# Altium footprint library Miscellaneous Devices LC.PcbLib: 776 footprints (part 30 of 49)
Each footprint in its own frame and in the unit in brackets; x right, y up, seen from the top. Pads: shape width x height; smd on the part's side, far side on the other; paste and mask are expansions set on the pad; w line width, h text height; cw(c..) or ccw(c..) is an arc to the next point about the centre after c.
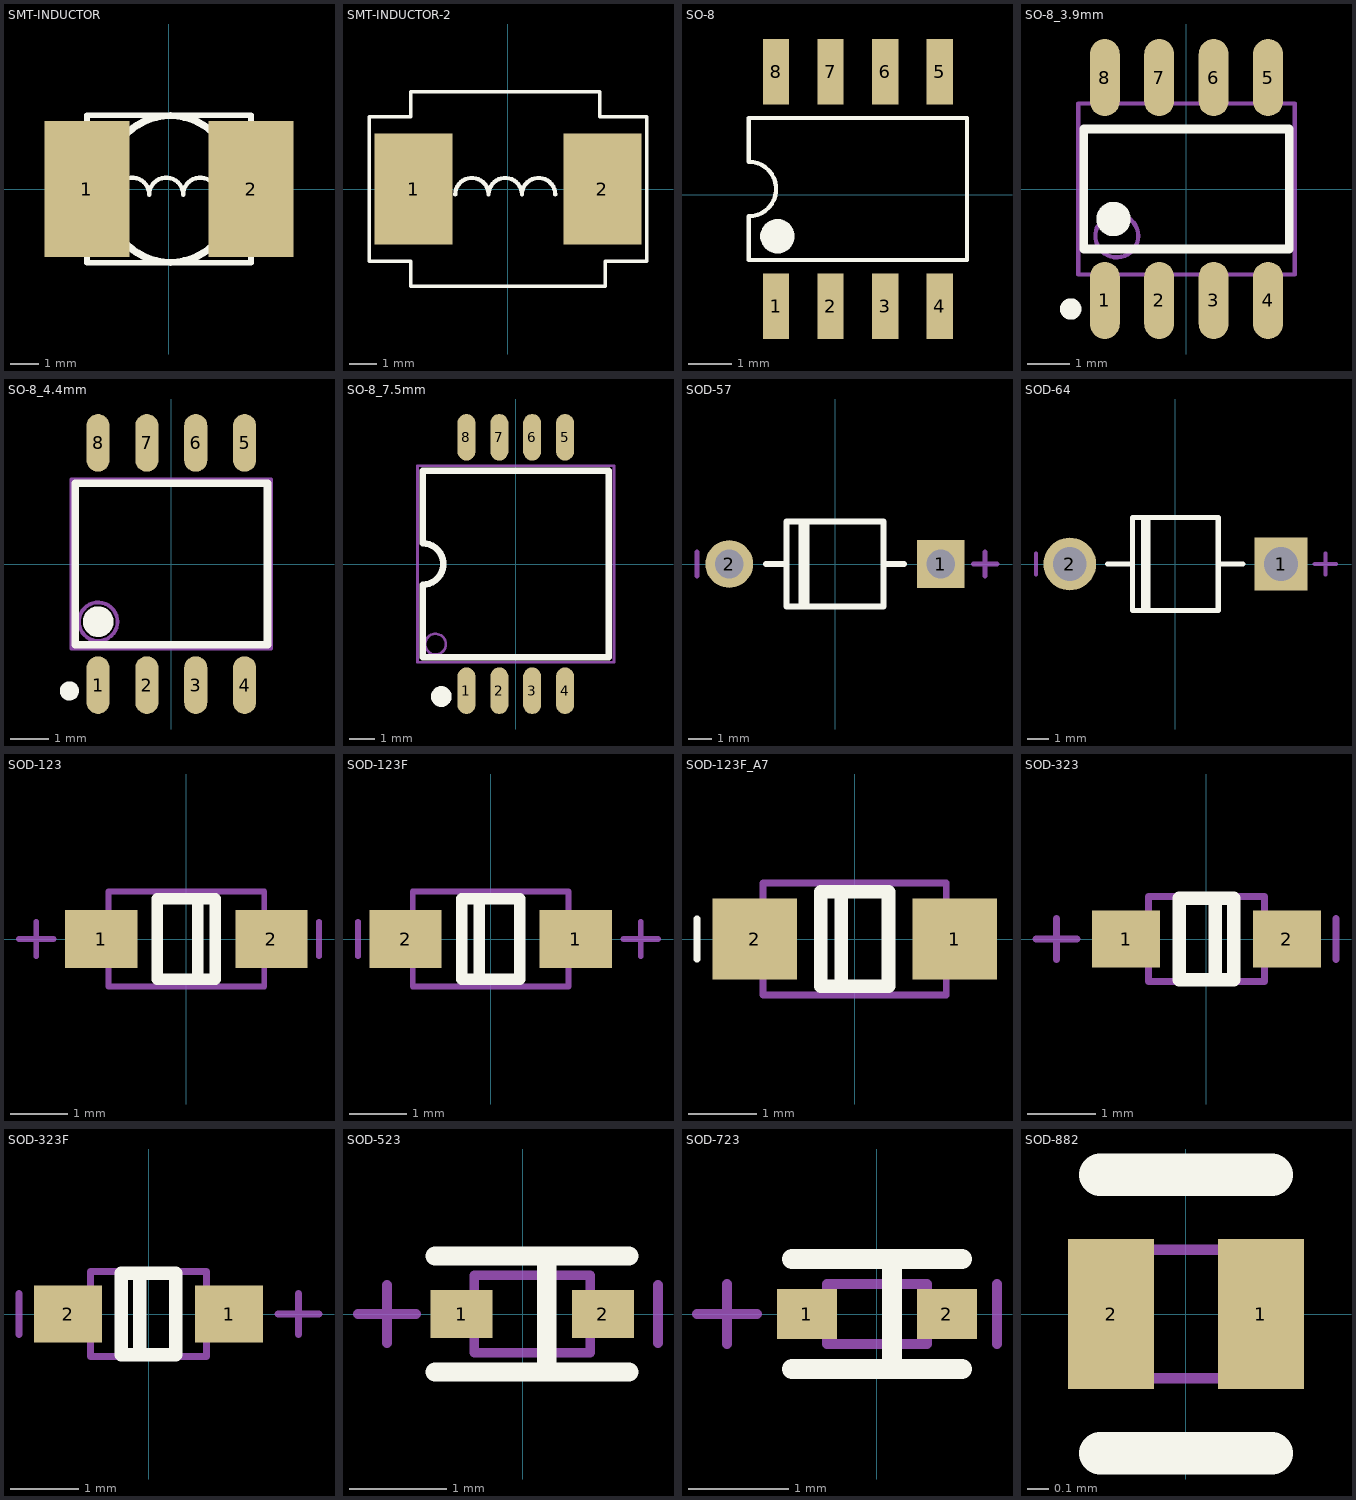
[diagram p29: the footprints below, top view; thin cyan lines are the x and y axes]

## SMT-INDUCTOR [mm]
pads (2):
  rect 3x4.8 smd: 1(-2.9,0) 2(2.9,0)
Top Overlay:
  lines w0.15: -1.9,-0.2 cw(c-1.3,-0.2) -0.7,-0.2 cw(c-0.1,-0.2) 0.5,-0.2 cw(c1.1,-0.2) 1.7,-0.2
  lines w0.2: -2.9,-1.6 -2.9,-2.6 0,-2.6 2.9,-2.6 2.9,-1.6 ; -2.9,1.6 -2.9,2.6 0,2.6 2.9,2.6 2.9,1.6
  lines w0.254: -1.5,-1.95 ccw(c0.05,-0.4) 1.6,-1.95 ; -1.5,1.95 cw(c0.05,0.4) 1.6,1.95
3D body "User Library-SPI0705 (SD75)贴片电感.step": height 3.3, standoff 0, extent -3.55,-3.7 3.75,3.6

## SMT-INDUCTOR-2 [mm]
pads (2):
  rect 2.8x4 smd: 1(-3.4,0) 2(3.4,0)
Top Overlay:
  lines w0.127: -5,-2.6 -5,2.6 -3.5,2.6 -3.5,3.5 3.3,3.5 3.3,2.6 5,2.6 5,-2.6 3.5,-2.6 3.5,-3.5 -3.5,-3.5 -3.5,-2.6 -5,-2.6
  lines w0.15: -1.9,-0.2 cw(c-1.3,-0.2) -0.7,-0.2 cw(c-0.1,-0.2) 0.5,-0.2 cw(c1.1,-0.2) 1.7,-0.2
3D body "User Library-SPI0705 (SD75)贴片电感.step": height 3.3, standoff 0, extent -3.677,-3.7 3.623,3.6

## SO-8 [mil]
pads (8):
  rect 24x60 smd: 1(178.5,-102.07) 2(228.5,-102.07) 3(278.5,-102.07) 4(328.5,-102.07) 5(328.5,112.93) 6(278.5,112.93) 7(228.5,112.93) 8(178.5,112.93)
Top Overlay:
  circle w19.68: c179.68,-37.87 r5.91
  lines w3.94: 153.5,-59.57 153.5,-19.57 ccw(c153.51,5.43) 153.51,30.43 153.5,70.43 353.5,70.43 353.5,-59.57 153.5,-59.57
3D body "SO8.STEP": height 57, standoff 0, extent 157,-108.75 350,118.75

## SO-8_3.9mm [mm]
pads (8):
  oval 0.7x1.8 smd: 1(-1.905,-2.6) 2(-0.635,-2.6) 3(0.635,-2.6) 4(1.905,-2.6) 5(1.905,2.6) 6(0.635,2.6) 7(-0.635,2.6) 8(-1.905,2.6)
Top Overlay:
  circle w0.25: c-2.7,-2.8 r0.125
  circle w0.4: c-1.7,-0.7 r0.2
  lines w0.2: -2.4,-1.4 -2.4,1.4 2.4,1.4 2.4,-1.4 -2.4,-1.4
Mechanical 13:
  circle w0.1: c-1.625,-1.095 r0.5
  lines w0.1: -2.525,-1.995 -2.525,1.995 2.525,1.995 2.525,-1.995 -2.525,-1.995

## SO-8_4.4mm [mm]
pads (8):
  oval 0.6x1.5 smd: 1(-1.905,-3.15) 2(-0.635,-3.15) 3(0.635,-3.15) 4(1.905,-3.15) 5(1.905,3.15) 6(0.635,3.15) 7(-0.635,3.15) 8(-1.905,3.15)
Top Overlay:
  circle w0.25: c-2.65,-3.3 r0.125
  circle w0.4: c-1.9,-1.5 r0.2
  lines w0.2: -2.5,-2.1 -2.5,2.1 2.5,2.1 2.5,-2.1 -2.5,-2.1
Mechanical 13:
  circle w0.1: c-1.9,-1.5 r0.5
  lines w0.1: -2.6,-2.2 -2.6,2.2 2.6,2.2 2.6,-2.2 -2.6,-2.2

## SO-8_7.5mm [mm]
pads (8):
  oval 0.7x1.8 smd: 1(-1.905,-4.9) 2(-0.635,-4.9) 3(0.635,-4.9) 4(1.905,-4.9) 5(1.905,4.9) 6(0.635,4.9) 7(-0.635,4.9) 8(-1.905,4.9)
Top Overlay:
  circle w0.4: c-2.875,-5.125 r0.2
  lines w0.254: -3.6,-3.6 3.6,-3.6 3.6,3.6 -3.6,3.6 -3.6,0.8 cw(c-3.6,0) -3.6,-0.8 -3.6,-3.6
Mechanical 13:
  circle w0.1: c-3.1,-3.1 r0.4
  lines w0.1: -3.8,-3.8 3.8,-3.8 3.8,3.8 -3.8,3.8 -3.8,-3.8

## SOD-57 [mm]
pads (2):
  rect 2x2 hole 1.2: 1(4.445,0)
  round 2 hole 1.2: 2(-4.445,0)
Top Overlay:
  lines w0.254: -2.9,0 -2.032,0 ; -1.4,-1.778 -1.4,1.778 ; -1.2,-1.778 -1.2,1.778 ; 2.032,0 2.9,0 ; -2.032,-1.778 2.032,-1.778 2.032,1.778 -2.032,1.778 -2.032,-1.778
Mechanical 15:
  lines w0.203: -5.8,-0.5 -5.8,0.5 ; 5.8,0 6.8,0 ; 6.3,-0.5 6.3,0.5

## SOD-64 [mm]
pads (2):
  rect 2.5x2.5 hole 1.6: 1(5,0)
  round 2.5 hole 1.6: 2(-5,0)
Top Overlay:
  lines w0.254: -3.2,0 -2.032,0 ; -1.5,-2.2 -1.5,2.2 ; -1.3,-2.2 -1.3,2.2 ; 2.032,0 3.2,0 ; -2.032,-2.2 -2.032,2.2 2.032,2.2 2.032,-2.2 -2.032,-2.2
Mechanical 15:
  lines w0.203: -6.6,-0.5 -6.6,0.5 ; 6.6,0 7.6,0 ; 7.1,-0.5 7.1,0.5

## SOD-123 [mm]
pads (2):
  rect 1.25x1 smd: 1(-1.475,0) 2(1.475,0)
Top Overlay:
  lines w0.2: 0.2,-0.7 0.2,0.7 ; -0.5,-0.7 -0.5,0.7 0.5,0.7 0.5,-0.7 -0.5,-0.7
Mechanical 13:
  lines w0.1: -1.35,-0.825 -1.35,0.825 1.35,0.825 1.35,-0.825 -1.35,-0.825
Mechanical 15:
  lines w0.1: -2.9,0 -2.3,0 ; -2.6,-0.3 -2.6,0.3 ; 2.3,-0.3 2.3,0.3
3D body "SOD-123.STEP": height 1.2, standoff 0, extent -1.85,-0.8 1.85,0.8

## SOD-123F [mm]
pads (2):
  rect 1.25x1 smd: 1(1.475,0) 2(-1.475,0)
Top Overlay:
  lines w0.2: -0.2,-0.7 -0.2,0.7 ; -0.5,-0.7 -0.5,0.7 0.5,0.7 0.5,-0.7 -0.5,-0.7
Mechanical 13:
  lines w0.1: -1.35,-0.825 1.35,-0.825 1.35,0.825 -1.35,0.825 -1.35,-0.825
Mechanical 15:
  lines w0.1: -2.3,-0.3 -2.3,0.3 ; 2.3,0 2.9,0 ; 2.6,-0.3 2.6,0.3
3D body "SOD123F.STEP": height 1.2, standoff -0.01, extent -1.9,-0.849 1.85,0.85

## SOD-123F_A7 [mm]
pads (2):
  rect 1.25x1.2 smd: 1(1.475,0) 2(-1.475,0)
Top Overlay:
  lines w0.1: -2.325,-0.3 -2.325,0.3
  lines w0.2: -0.2,-0.7 -0.2,0.7 ; -0.5,-0.7 -0.5,0.7 0.5,0.7 0.5,-0.7 -0.5,-0.7
Mechanical 13:
  lines w0.1: -1.35,-0.825 1.35,-0.825 1.35,0.825 -1.35,0.825 -1.35,-0.825
3D body "SOD123F.STEP": height 1.2, standoff -0.01, extent -1.9,-0.849 1.85,0.85

## SOD-323 [mm]
pads (2):
  rect 1x0.83 smd: 1(-1.18,0) 2(1.18,0)
Top Overlay:
  lines w0.2: 0.13,-0.6 0.13,0.6 ; -0.4,-0.6 -0.4,0.6 0.4,0.6 0.4,-0.6 -0.4,-0.6
Mechanical 13:
  lines w0.1: -0.85,-0.625 0.85,-0.625 0.85,0.625 -0.85,0.625 -0.85,-0.625
Mechanical 15:
  lines w0.1: -2.5,0 -1.9,0 ; -2.2,-0.3 -2.2,0.3 ; 1.9,-0.3 1.9,0.3
3D body "SOD323.STEP": height 1.1, standoff 0, extent -1.35,-0.625 1.35,0.625

## SOD-323F [mm]
pads (2):
  rect 1x0.83 smd: 1(1.18,0) 2(-1.18,0)
Top Overlay:
  lines w0.2: -0.13,-0.6 -0.13,0.6 ; -0.4,-0.6 -0.4,0.6 0.4,0.6 0.4,-0.6 -0.4,-0.6
Mechanical 13:
  lines w0.1: -0.85,-0.625 0.85,-0.625 0.85,0.625 -0.85,0.625 -0.85,-0.625
Mechanical 15:
  lines w0.1: -1.9,-0.3 -1.9,0.3 ; 1.9,0 2.5,0 ; 2.2,-0.3 2.2,0.3
3D body "SOD323F.STEP": height 0.75, standoff -0.01, extent -1.4,-0.675 1.4,0.675

## SOD-523 [mm]
pads (2):
  rect 0.64x0.5 smd: 1(-0.63,0) 2(0.83,0)
Top Overlay:
  lines w0.2: -0.9,-0.6 1.1,-0.6 ; -0.9,0.6 1.1,0.6 ; 0.25,-0.6 0.25,0.575
Mechanical 13:
  lines w0.1: -0.5,-0.4 -0.5,0.4 0.7,0.4 0.7,-0.4 -0.5,-0.4
Mechanical 15:
  lines w0.1: -1.7,0 -1.1,0 ; -1.4,-0.3 -1.4,0.3 ; 1.4,-0.3 1.4,0.3
3D body "SOD-523.STEP": height 0.65, standoff 0, extent -0.7,-0.4 0.9,0.4

## SOD-723 [mm]
pads (2):
  rect 0.6x0.5 smd: 1(-0.7,0) 2(0.7,0)
Top Overlay:
  lines w0.2: -0.85,-0.55 0.85,-0.55 ; -0.85,0.55 0.85,0.55 ; 0.15,-0.55 0.15,0.55
Mechanical 13:
  lines w0.1: -0.5,-0.3 -0.5,0.3 0.5,0.3 0.5,-0.3 -0.5,-0.3
Mechanical 15:
  lines w0.1: -1.8,0 -1.2,0 ; -1.5,-0.3 -1.5,0.3 ; 1.2,-0.3 1.2,0.3
3D body "SOD-723.STEP": height 0.58, standoff 0, extent -0.7,-0.3 0.7,0.3

## SOD-882 [mm]
pads (2):
  rect 0.4x0.7 smd mask+0.051: 1(0.35,0) 2(-0.35,0)
Top Overlay:
  lines w0.2: -0.4,-0.65 0.4,-0.65 ; -0.4,0.65 0.4,0.65
Mechanical 13:
  lines w0.05: -0.5,-0.3 0.5,-0.3 0.5,0.3 -0.5,0.3 -0.5,-0.3